# Altium integrated library Weidmueller_OMNIMATE_Signal.IntLib: 2550 symbols (part 26 of 45)
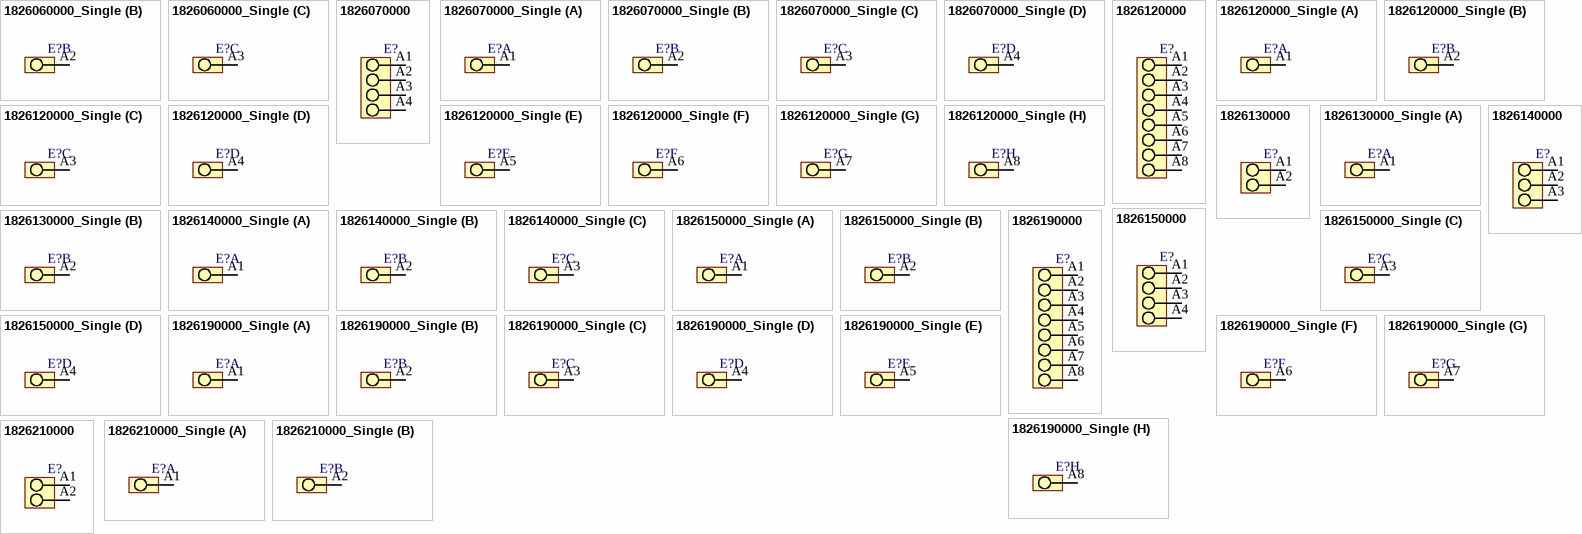
[diagram p236: symbols 1826060000_Single to 1826210000_Single]

## 1826190000
designator E?
OMNIMATE Signal - series LSF; PartNumber: 1826190000; Manufacturer: Weidmueller; Short_text_for_material: LSF-SMT 7.50/08/180 3.5SN BK TU; Side_termination_characteristic: closed side; Mounting_onto_the_PCB: Reflow solder connection; Pitch_mm: 7,5 mm; Pitch_inch: 0,295 inch; No_of_poles: 8; Solder_pin_length_mm: 3,5 mm; Contact_material: Cu-Leg; Contact_surface: tinned; Insulating_material: LCP GF; UL_94_flammability_rating: V-0; Rated_voltage_for_surge_voltage_class_pollution_degree_II_2: 800 V; Rated_current_min_no_of_poles_TU_20_deg_C: 19 A; Solid_min_H05_07_V_U: 0,2 mm²; Solid_max_H05_07_V_U: 1,5 mm²; Rated_voltage_use_group_B_UL_1059: 300 V; Rated_current_use_group_B_UL_1059: 12 A; Wire_cross_section_AWG_min_UL_1059: AWG 24; Wire_cross_section_AWG_max_UL_1059: AWG 16; PackageReference: LSF_SMT_7_5_180_08; Colour: Black; Packaging: Tube; Qty: 9 PCS; Revision: V1; ComponentLink1Description: Manufacturer URL; ComponentLink1URL: http://www.weidmueller.com/; ComponentLink2Description: URL Link1; ComponentLink2URL: http://catalog.weidmueller.com/catalog/Start.do?localeId=en&ObjectID=1826190000
footprint LSF_SMT_7_5_180_08 (OMNIMATE Signal - Serie LSF  LSF-SMT 7.50/08/180 3.5)
pins: A1, A2, A3, A4, A5, A6, A7, A8
1 alternate drawing of the same symbol

## 1826190000_Single
designator E?
OMNIMATE Signal - series LSF; PartNumber: 1826190000; Manufacturer: Weidmueller; Short_text_for_material: LSF-SMT 7.50/08/180 3.5SN BK TU; Side_termination_characteristic: closed side; Mounting_onto_the_PCB: Reflow solder connection; Pitch_mm: 7,5 mm; Pitch_inch: 0,295 inch; No_of_poles: 8; Solder_pin_length_mm: 3,5 mm; Contact_material: Cu-Leg; Contact_surface: tinned; Insulating_material: LCP GF; UL_94_flammability_rating: V-0; Rated_voltage_for_surge_voltage_class_pollution_degree_II_2: 800 V; Rated_current_min_no_of_poles_TU_20_deg_C: 19 A; Solid_min_H05_07_V_U: 0,2 mm²; Solid_max_H05_07_V_U: 1,5 mm²; Rated_voltage_use_group_B_UL_1059: 300 V; Rated_current_use_group_B_UL_1059: 12 A; Wire_cross_section_AWG_min_UL_1059: AWG 24; Wire_cross_section_AWG_max_UL_1059: AWG 16; PackageReference: LSF_SMT_7_5_180_08; Colour: Black; Packaging: Tube; Qty: 9 PCS; Revision: V1; ComponentLink1Description: Manufacturer URL; ComponentLink1URL: http://www.weidmueller.com/; ComponentLink2Description: URL Link1; ComponentLink2URL: http://catalog.weidmueller.com/catalog/Start.do?localeId=en&ObjectID=1826190000
footprint LSF_SMT_7_5_180_08 (OMNIMATE Signal - Serie LSF  LSF-SMT 7.50/08/180 3.5)
part A pins: A1
part B pins: A2
part C pins: A3
part D pins: A4
part E pins: A5
part F pins: A6
part G pins: A7
part H pins: A8
1 alternate drawing of the same symbol

## 1826210000
designator E?
OMNIMATE Signal - series LSF; PartNumber: 1826210000; Manufacturer: Weidmueller; Short_text_for_material: LSF-SMT 7.62/02/180 3.5SN BK TU; Side_termination_characteristic: closed side; Mounting_onto_the_PCB: Reflow solder connection; Pitch_mm: 7,62 mm; Pitch_inch: 0,3 inch; No_of_poles: 2; Solder_pin_length_mm: 3,5 mm; Contact_material: Cu-Leg; Contact_surface: tinned; Insulating_material: LCP GF; UL_94_flammability_rating: V-0; Rated_voltage_for_surge_voltage_class_pollution_degree_II_2: 800 V; Rated_current_min_no_of_poles_TU_20_deg_C: 19 A; Solid_min_H05_07_V_U: 0,2 mm²; Solid_max_H05_07_V_U: 1,5 mm²; Rated_voltage_use_group_B_UL_1059: 300 V; Rated_current_use_group_B_UL_1059: 12 A; Wire_cross_section_AWG_min_UL_1059: AWG 24; Wire_cross_section_AWG_max_UL_1059: AWG 16; PackageReference: LSF_SMT_7_62_180_02; Colour: Black; Packaging: Tube; Qty: 46 PCS; Revision: V1; ComponentLink1Description: Manufacturer URL; ComponentLink1URL: http://www.weidmueller.com/; ComponentLink2Description: URL Link1; ComponentLink2URL: http://catalog.weidmueller.com/catalog/Start.do?localeId=en&ObjectID=1826210000
footprint LSF_SMT_7_62_180_02 (OMNIMATE Signal - Serie LSF  LSF-SMT 7.62/02/180 3.5)
pins: A1, A2
1 alternate drawing of the same symbol

## 1826210000_Single
designator E?
OMNIMATE Signal - series LSF; PartNumber: 1826210000; Manufacturer: Weidmueller; Short_text_for_material: LSF-SMT 7.62/02/180 3.5SN BK TU; Side_termination_characteristic: closed side; Mounting_onto_the_PCB: Reflow solder connection; Pitch_mm: 7,62 mm; Pitch_inch: 0,3 inch; No_of_poles: 2; Solder_pin_length_mm: 3,5 mm; Contact_material: Cu-Leg; Contact_surface: tinned; Insulating_material: LCP GF; UL_94_flammability_rating: V-0; Rated_voltage_for_surge_voltage_class_pollution_degree_II_2: 800 V; Rated_current_min_no_of_poles_TU_20_deg_C: 19 A; Solid_min_H05_07_V_U: 0,2 mm²; Solid_max_H05_07_V_U: 1,5 mm²; Rated_voltage_use_group_B_UL_1059: 300 V; Rated_current_use_group_B_UL_1059: 12 A; Wire_cross_section_AWG_min_UL_1059: AWG 24; Wire_cross_section_AWG_max_UL_1059: AWG 16; PackageReference: LSF_SMT_7_62_180_02; Colour: Black; Packaging: Tube; Qty: 46 PCS; Revision: V1; ComponentLink1Description: Manufacturer URL; ComponentLink1URL: http://www.weidmueller.com/; ComponentLink2Description: URL Link1; ComponentLink2URL: http://catalog.weidmueller.com/catalog/Start.do?localeId=en&ObjectID=1826210000
footprint LSF_SMT_7_62_180_02 (OMNIMATE Signal - Serie LSF  LSF-SMT 7.62/02/180 3.5)
part A pins: A1
part B pins: A2
1 alternate drawing of the same symbol

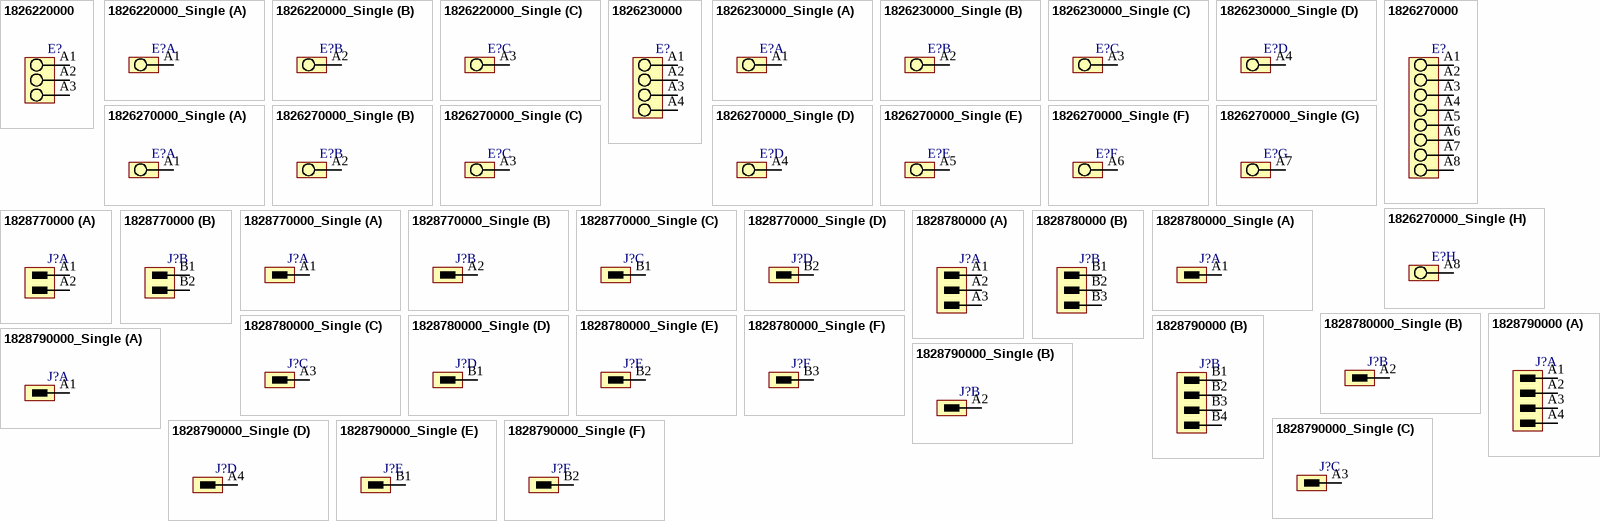
[diagram p132: symbols 1826220000 to 1828790000_Single]

## 1826220000
designator E?
OMNIMATE Signal - series LSF; PartNumber: 1826220000; Manufacturer: Weidmueller; Short_text_for_material: LSF-SMT 7.62/03/180 3.5SN BK TU; Side_termination_characteristic: closed side; Mounting_onto_the_PCB: Reflow solder connection; Pitch_mm: 7,62 mm; Pitch_inch: 0,3 inch; No_of_poles: 3; Solder_pin_length_mm: 3,5 mm; Contact_material: Cu-Leg; Contact_surface: tinned; Insulating_material: LCP GF; UL_94_flammability_rating: V-0; Rated_voltage_for_surge_voltage_class_pollution_degree_II_2: 800 V; Rated_current_min_no_of_poles_TU_20_deg_C: 19 A; Solid_min_H05_07_V_U: 0,2 mm²; Solid_max_H05_07_V_U: 1,5 mm²; Rated_voltage_use_group_B_UL_1059: 300 V; Rated_current_use_group_B_UL_1059: 12 A; Wire_cross_section_AWG_min_UL_1059: AWG 24; Wire_cross_section_AWG_max_UL_1059: AWG 16; PackageReference: LSF_SMT_7_62_180_03; Colour: Black; Packaging: Tube; Qty: 28 PCS; Revision: V1; ComponentLink1Description: Manufacturer URL; ComponentLink1URL: http://www.weidmueller.com/; ComponentLink2Description: URL Link1; ComponentLink2URL: http://catalog.weidmueller.com/catalog/Start.do?localeId=en&ObjectID=1826220000
footprint LSF_SMT_7_62_180_03 (OMNIMATE Signal - Serie LSF  LSF-SMT 7.62/03/180 3.5)
pins: A1, A2, A3
1 alternate drawing of the same symbol

## 1826220000_Single
designator E?
OMNIMATE Signal - series LSF; PartNumber: 1826220000; Manufacturer: Weidmueller; Short_text_for_material: LSF-SMT 7.62/03/180 3.5SN BK TU; Side_termination_characteristic: closed side; Mounting_onto_the_PCB: Reflow solder connection; Pitch_mm: 7,62 mm; Pitch_inch: 0,3 inch; No_of_poles: 3; Solder_pin_length_mm: 3,5 mm; Contact_material: Cu-Leg; Contact_surface: tinned; Insulating_material: LCP GF; UL_94_flammability_rating: V-0; Rated_voltage_for_surge_voltage_class_pollution_degree_II_2: 800 V; Rated_current_min_no_of_poles_TU_20_deg_C: 19 A; Solid_min_H05_07_V_U: 0,2 mm²; Solid_max_H05_07_V_U: 1,5 mm²; Rated_voltage_use_group_B_UL_1059: 300 V; Rated_current_use_group_B_UL_1059: 12 A; Wire_cross_section_AWG_min_UL_1059: AWG 24; Wire_cross_section_AWG_max_UL_1059: AWG 16; PackageReference: LSF_SMT_7_62_180_03; Colour: Black; Packaging: Tube; Qty: 28 PCS; Revision: V1; ComponentLink1Description: Manufacturer URL; ComponentLink1URL: http://www.weidmueller.com/; ComponentLink2Description: URL Link1; ComponentLink2URL: http://catalog.weidmueller.com/catalog/Start.do?localeId=en&ObjectID=1826220000
footprint LSF_SMT_7_62_180_03 (OMNIMATE Signal - Serie LSF  LSF-SMT 7.62/03/180 3.5)
part A pins: A1
part B pins: A2
part C pins: A3
1 alternate drawing of the same symbol

## 1826230000
designator E?
OMNIMATE Signal - series LSF; PartNumber: 1826230000; Manufacturer: Weidmueller; Short_text_for_material: LSF-SMT 7.62/04/180 3.5SN BK TU; Side_termination_characteristic: closed side; Mounting_onto_the_PCB: Reflow solder connection; Pitch_mm: 7,62 mm; Pitch_inch: 0,3 inch; No_of_poles: 4; Solder_pin_length_mm: 3,5 mm; Contact_material: Cu-Leg; Contact_surface: tinned; Insulating_material: LCP GF; UL_94_flammability_rating: V-0; Rated_voltage_for_surge_voltage_class_pollution_degree_II_2: 800 V; Rated_current_min_no_of_poles_TU_20_deg_C: 19 A; Solid_min_H05_07_V_U: 0,2 mm²; Solid_max_H05_07_V_U: 1,5 mm²; Rated_voltage_use_group_B_UL_1059: 300 V; Rated_current_use_group_B_UL_1059: 12 A; Wire_cross_section_AWG_min_UL_1059: AWG 24; Wire_cross_section_AWG_max_UL_1059: AWG 16; PackageReference: LSF_SMT_7_62_180_04; Colour: Black; Packaging: Tube; Qty: 20 PCS; Revision: V1; ComponentLink1Description: Manufacturer URL; ComponentLink1URL: http://www.weidmueller.com/; ComponentLink2Description: URL Link1; ComponentLink2URL: http://catalog.weidmueller.com/catalog/Start.do?localeId=en&ObjectID=1826230000
footprint LSF_SMT_7_62_180_04 (OMNIMATE Signal - Serie LSF  LSF-SMT 7.62/04/180 3.5)
pins: A1, A2, A3, A4
1 alternate drawing of the same symbol

## 1826230000_Single
designator E?
OMNIMATE Signal - series LSF; PartNumber: 1826230000; Manufacturer: Weidmueller; Short_text_for_material: LSF-SMT 7.62/04/180 3.5SN BK TU; Side_termination_characteristic: closed side; Mounting_onto_the_PCB: Reflow solder connection; Pitch_mm: 7,62 mm; Pitch_inch: 0,3 inch; No_of_poles: 4; Solder_pin_length_mm: 3,5 mm; Contact_material: Cu-Leg; Contact_surface: tinned; Insulating_material: LCP GF; UL_94_flammability_rating: V-0; Rated_voltage_for_surge_voltage_class_pollution_degree_II_2: 800 V; Rated_current_min_no_of_poles_TU_20_deg_C: 19 A; Solid_min_H05_07_V_U: 0,2 mm²; Solid_max_H05_07_V_U: 1,5 mm²; Rated_voltage_use_group_B_UL_1059: 300 V; Rated_current_use_group_B_UL_1059: 12 A; Wire_cross_section_AWG_min_UL_1059: AWG 24; Wire_cross_section_AWG_max_UL_1059: AWG 16; PackageReference: LSF_SMT_7_62_180_04; Colour: Black; Packaging: Tube; Qty: 20 PCS; Revision: V1; ComponentLink1Description: Manufacturer URL; ComponentLink1URL: http://www.weidmueller.com/; ComponentLink2Description: URL Link1; ComponentLink2URL: http://catalog.weidmueller.com/catalog/Start.do?localeId=en&ObjectID=1826230000
footprint LSF_SMT_7_62_180_04 (OMNIMATE Signal - Serie LSF  LSF-SMT 7.62/04/180 3.5)
part A pins: A1
part B pins: A2
part C pins: A3
part D pins: A4
1 alternate drawing of the same symbol

## 1826270000
designator E?
OMNIMATE Signal - series LSF; PartNumber: 1826270000; Manufacturer: Weidmueller; Short_text_for_material: LSF-SMT 7.62/08/180 3.5SN BK TU; Side_termination_characteristic: closed side; Mounting_onto_the_PCB: Reflow solder connection; Pitch_mm: 7,62 mm; Pitch_inch: 0,3 inch; No_of_poles: 8; Solder_pin_length_mm: 3,5 mm; Contact_material: Cu-Leg; Contact_surface: tinned; Insulating_material: LCP GF; UL_94_flammability_rating: V-0; Rated_voltage_for_surge_voltage_class_pollution_degree_II_2: 800 V; Rated_current_min_no_of_poles_TU_20_deg_C: 19 A; Solid_min_H05_07_V_U: 0,2 mm²; Solid_max_H05_07_V_U: 1,5 mm²; Rated_voltage_use_group_B_UL_1059: 300 V; Rated_current_use_group_B_UL_1059: 12 A; Wire_cross_section_AWG_min_UL_1059: AWG 24; Wire_cross_section_AWG_max_UL_1059: AWG 16; PackageReference: LSF_SMT_7_62_180_08; Colour: Black; Packaging: Tube; Qty: 9 PCS; Revision: V1; ComponentLink1Description: Manufacturer URL; ComponentLink1URL: http://www.weidmueller.com/; ComponentLink2Description: URL Link1; ComponentLink2URL: http://catalog.weidmueller.com/catalog/Start.do?localeId=en&ObjectID=1826270000
footprint LSF_SMT_7_62_180_08 (OMNIMATE Signal - Serie LSF  LSF-SMT 7.62/08/180 3.5)
pins: A1, A2, A3, A4, A5, A6, A7, A8
1 alternate drawing of the same symbol

## 1826270000_Single
designator E?
OMNIMATE Signal - series LSF; PartNumber: 1826270000; Manufacturer: Weidmueller; Short_text_for_material: LSF-SMT 7.62/08/180 3.5SN BK TU; Side_termination_characteristic: closed side; Mounting_onto_the_PCB: Reflow solder connection; Pitch_mm: 7,62 mm; Pitch_inch: 0,3 inch; No_of_poles: 8; Solder_pin_length_mm: 3,5 mm; Contact_material: Cu-Leg; Contact_surface: tinned; Insulating_material: LCP GF; UL_94_flammability_rating: V-0; Rated_voltage_for_surge_voltage_class_pollution_degree_II_2: 800 V; Rated_current_min_no_of_poles_TU_20_deg_C: 19 A; Solid_min_H05_07_V_U: 0,2 mm²; Solid_max_H05_07_V_U: 1,5 mm²; Rated_voltage_use_group_B_UL_1059: 300 V; Rated_current_use_group_B_UL_1059: 12 A; Wire_cross_section_AWG_min_UL_1059: AWG 24; Wire_cross_section_AWG_max_UL_1059: AWG 16; PackageReference: LSF_SMT_7_62_180_08; Colour: Black; Packaging: Tube; Qty: 9 PCS; Revision: V1; ComponentLink1Description: Manufacturer URL; ComponentLink1URL: http://www.weidmueller.com/; ComponentLink2Description: URL Link1; ComponentLink2URL: http://catalog.weidmueller.com/catalog/Start.do?localeId=en&ObjectID=1826270000
footprint LSF_SMT_7_62_180_08 (OMNIMATE Signal - Serie LSF  LSF-SMT 7.62/08/180 3.5)
part A pins: A1
part B pins: A2
part C pins: A3
part D pins: A4
part E pins: A5
part F pins: A6
part G pins: A7
part H pins: A8
1 alternate drawing of the same symbol

## 1828770000
designator J?
OMNIMATE Signal - series BL/SL 5.08; PartNumber: 1828770000; Manufacturer: Weidmueller; Short_text_for_material: SLDV-THR 5.08/04/180F 3.2SN BK BX; Side_termination_characteristic: Flange; Mounting_onto_the_PCB: Reflow solder connection; Pitch_mm: 5.08 mm; Pitch_inch: 0.2 inch; No_of_poles: 4; Outgoing_elbow: 180°; Solder_pin_length_mm: 3.2 mm; Contact_material: CuSn; Contact_surface: tinned; Insulating_material: LCP GF; UL_94_flammability_rating: V-0; Rated_voltage_for_surge_voltage_class_pollution_degree_II_2: 400 V; Rated_current_min_no_of_poles_TU_20_deg_C: 19 A; Rated_voltage_use_group_B_UL_1059: 300 V; Rated_current_use_group_B_UL_1059: 10 A; PackageReference: SLDV_THR_5_08_180F_04; Colour: Black; Packaging: Box; Qty: 50 PCS; Revision: V1; ComponentLink1Description: Manufacturer URL; ComponentLink1URL: http://www.weidmueller.com/; ComponentLink2Description: URL Link1; ComponentLink2URL: http://catalog.weidmueller.com/catalog/Start.do?localeId=en&ObjectID=1828770000
footprint SLDV_THR_5_08_180F_04 (OMNIMATE Signal - Serie BL/SL 5.08  SLDV-THR 5.08/04/180F 3.2)
part A pins: A1, A2
part B pins: B1, B2

## 1828770000_Single
designator J?
OMNIMATE Signal - series BL/SL 5.08; PartNumber: 1828770000; Manufacturer: Weidmueller; Short_text_for_material: SLDV-THR 5.08/04/180F 3.2SN BK BX; Side_termination_characteristic: Flange; Mounting_onto_the_PCB: Reflow solder connection; Pitch_mm: 5.08 mm; Pitch_inch: 0.2 inch; No_of_poles: 4; Outgoing_elbow: 180°; Solder_pin_length_mm: 3.2 mm; Contact_material: CuSn; Contact_surface: tinned; Insulating_material: LCP GF; UL_94_flammability_rating: V-0; Rated_voltage_for_surge_voltage_class_pollution_degree_II_2: 400 V; Rated_current_min_no_of_poles_TU_20_deg_C: 19 A; Rated_voltage_use_group_B_UL_1059: 300 V; Rated_current_use_group_B_UL_1059: 10 A; PackageReference: SLDV_THR_5_08_180F_04; Colour: Black; Packaging: Box; Qty: 50 PCS; Revision: V1; ComponentLink1Description: Manufacturer URL; ComponentLink1URL: http://www.weidmueller.com/; ComponentLink2Description: URL Link1; ComponentLink2URL: http://catalog.weidmueller.com/catalog/Start.do?localeId=en&ObjectID=1828770000
footprint SLDV_THR_5_08_180F_04 (OMNIMATE Signal - Serie BL/SL 5.08  SLDV-THR 5.08/04/180F 3.2)
part A pins: A1
part B pins: A2
part C pins: B1
part D pins: B2

## 1828780000
designator J?
OMNIMATE Signal - series BL/SL 5.08; PartNumber: 1828780000; Manufacturer: Weidmueller; Short_text_for_material: SLDV-THR 5.08/06/180F 3.2SN BK BX; Side_termination_characteristic: Flange; Mounting_onto_the_PCB: Reflow solder connection; Pitch_mm: 5.08 mm; Pitch_inch: 0.2 inch; No_of_poles: 6; Outgoing_elbow: 180°; Solder_pin_length_mm: 3.2 mm; Contact_material: CuSn; Contact_surface: tinned; Insulating_material: LCP GF; UL_94_flammability_rating: V-0; Rated_voltage_for_surge_voltage_class_pollution_degree_II_2: 400 V; Rated_current_min_no_of_poles_TU_20_deg_C: 19 A; Rated_voltage_use_group_B_UL_1059: 300 V; Rated_current_use_group_B_UL_1059: 10 A; PackageReference: SLDV_THR_5_08_180F_06; Colour: Black; Packaging: Box; Qty: 50 PCS; Revision: V1; ComponentLink1Description: Manufacturer URL; ComponentLink1URL: http://www.weidmueller.com/; ComponentLink2Description: URL Link1; ComponentLink2URL: http://catalog.weidmueller.com/catalog/Start.do?localeId=en&ObjectID=1828780000
footprint SLDV_THR_5_08_180F_06 (OMNIMATE Signal - Serie BL/SL 5.08  SLDV-THR 5.08/06/180F 3.2)
part A pins: A1, A2, A3
part B pins: B1, B2, B3

## 1828780000_Single
designator J?
OMNIMATE Signal - series BL/SL 5.08; PartNumber: 1828780000; Manufacturer: Weidmueller; Short_text_for_material: SLDV-THR 5.08/06/180F 3.2SN BK BX; Side_termination_characteristic: Flange; Mounting_onto_the_PCB: Reflow solder connection; Pitch_mm: 5.08 mm; Pitch_inch: 0.2 inch; No_of_poles: 6; Outgoing_elbow: 180°; Solder_pin_length_mm: 3.2 mm; Contact_material: CuSn; Contact_surface: tinned; Insulating_material: LCP GF; UL_94_flammability_rating: V-0; Rated_voltage_for_surge_voltage_class_pollution_degree_II_2: 400 V; Rated_current_min_no_of_poles_TU_20_deg_C: 19 A; Rated_voltage_use_group_B_UL_1059: 300 V; Rated_current_use_group_B_UL_1059: 10 A; PackageReference: SLDV_THR_5_08_180F_06; Colour: Black; Packaging: Box; Qty: 50 PCS; Revision: V1; ComponentLink1Description: Manufacturer URL; ComponentLink1URL: http://www.weidmueller.com/; ComponentLink2Description: URL Link1; ComponentLink2URL: http://catalog.weidmueller.com/catalog/Start.do?localeId=en&ObjectID=1828780000
footprint SLDV_THR_5_08_180F_06 (OMNIMATE Signal - Serie BL/SL 5.08  SLDV-THR 5.08/06/180F 3.2)
part A pins: A1
part B pins: A2
part C pins: A3
part D pins: B1
part E pins: B2
part F pins: B3

## 1828790000
designator J?
OMNIMATE Signal - series BL/SL 5.08; PartNumber: 1828790000; Manufacturer: Weidmueller; Short_text_for_material: SLDV-THR 5.08/08/180F 3.2SN BK BX; Side_termination_characteristic: Flange; Mounting_onto_the_PCB: Reflow solder connection; Pitch_mm: 5.08 mm; Pitch_inch: 0.2 inch; No_of_poles: 8; Outgoing_elbow: 180°; Solder_pin_length_mm: 3.2 mm; Contact_material: CuSn; Contact_surface: tinned; Insulating_material: LCP GF; UL_94_flammability_rating: V-0; Rated_voltage_for_surge_voltage_class_pollution_degree_II_2: 400 V; Rated_current_min_no_of_poles_TU_20_deg_C: 19 A; Rated_voltage_use_group_B_UL_1059: 300 V; Rated_current_use_group_B_UL_1059: 10 A; PackageReference: SLDV_THR_5_08_180F_08; Colour: Black; Packaging: Box; Qty: 50 PCS; Revision: V1; ComponentLink1Description: Manufacturer URL; ComponentLink1URL: http://www.weidmueller.com/; ComponentLink2Description: URL Link1; ComponentLink2URL: http://catalog.weidmueller.com/catalog/Start.do?localeId=en&ObjectID=1828790000
footprint SLDV_THR_5_08_180F_08 (OMNIMATE Signal - Serie BL/SL 5.08  SLDV-THR 5.08/08/180F 3.2)
part A pins: A1, A2, A3, A4
part B pins: B1, B2, B3, B4

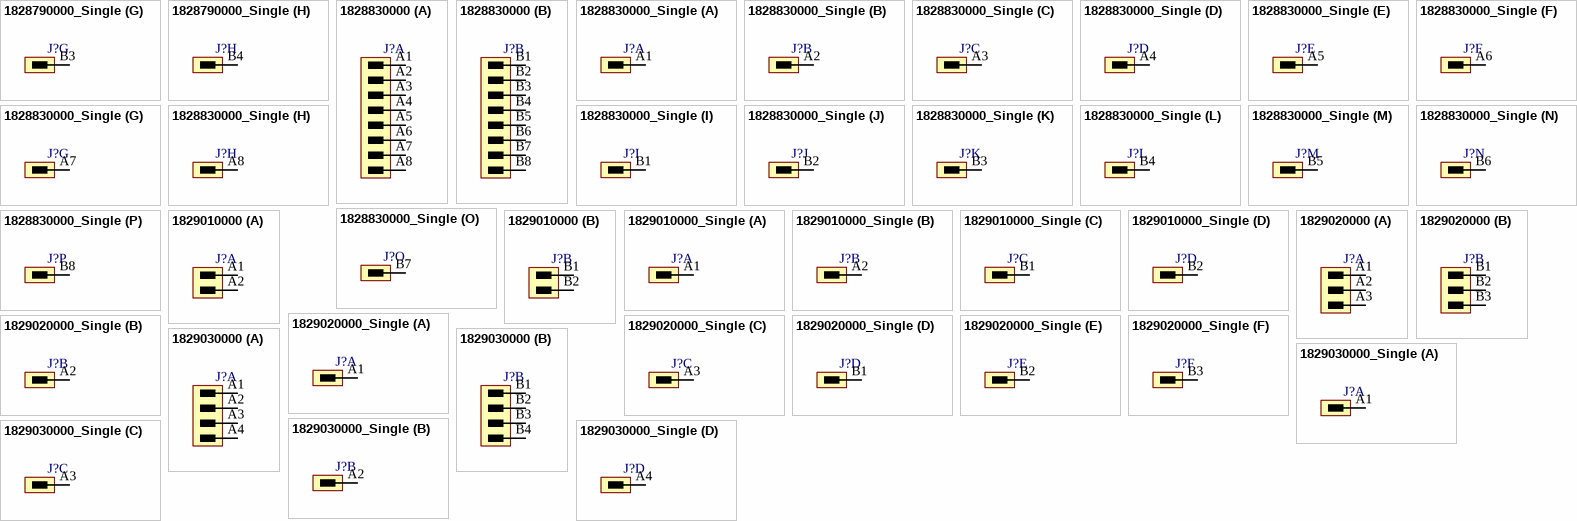
[diagram p133: symbols 1828790000_Single to 1829030000_Single]

## 1828790000_Single
designator J?
OMNIMATE Signal - series BL/SL 5.08; PartNumber: 1828790000; Manufacturer: Weidmueller; Short_text_for_material: SLDV-THR 5.08/08/180F 3.2SN BK BX; Side_termination_characteristic: Flange; Mounting_onto_the_PCB: Reflow solder connection; Pitch_mm: 5.08 mm; Pitch_inch: 0.2 inch; No_of_poles: 8; Outgoing_elbow: 180°; Solder_pin_length_mm: 3.2 mm; Contact_material: CuSn; Contact_surface: tinned; Insulating_material: LCP GF; UL_94_flammability_rating: V-0; Rated_voltage_for_surge_voltage_class_pollution_degree_II_2: 400 V; Rated_current_min_no_of_poles_TU_20_deg_C: 19 A; Rated_voltage_use_group_B_UL_1059: 300 V; Rated_current_use_group_B_UL_1059: 10 A; PackageReference: SLDV_THR_5_08_180F_08; Colour: Black; Packaging: Box; Qty: 50 PCS; Revision: V1; ComponentLink1Description: Manufacturer URL; ComponentLink1URL: http://www.weidmueller.com/; ComponentLink2Description: URL Link1; ComponentLink2URL: http://catalog.weidmueller.com/catalog/Start.do?localeId=en&ObjectID=1828790000
footprint SLDV_THR_5_08_180F_08 (OMNIMATE Signal - Serie BL/SL 5.08  SLDV-THR 5.08/08/180F 3.2)
part A pins: A1
part B pins: A2
part C pins: A3
part D pins: A4
part E pins: B1
part F pins: B2
part G pins: B3
part H pins: B4

## 1828830000
designator J?
OMNIMATE Signal - series BL/SL 5.08; PartNumber: 1828830000; Manufacturer: Weidmueller; Short_text_for_material: SLDV-THR 5.08/16/180F 3.2SN BK BX; Side_termination_characteristic: Flange; Mounting_onto_the_PCB: Reflow solder connection; Pitch_mm: 5.08 mm; Pitch_inch: 0.2 inch; No_of_poles: 16; Outgoing_elbow: 180°; Solder_pin_length_mm: 3.2 mm; Contact_material: CuSn; Contact_surface: tinned; Insulating_material: LCP GF; UL_94_flammability_rating: V-0; Rated_voltage_for_surge_voltage_class_pollution_degree_II_2: 400 V; Rated_current_min_no_of_poles_TU_20_deg_C: 19 A; Rated_voltage_use_group_B_UL_1059: 300 V; Rated_current_use_group_B_UL_1059: 10 A; PackageReference: SLDV_THR_5_08_180F_16; Colour: Black; Packaging: Box; Qty: 20 PCS; Revision: V1; ComponentLink1Description: Manufacturer URL; ComponentLink1URL: http://www.weidmueller.com/; ComponentLink2Description: URL Link1; ComponentLink2URL: http://catalog.weidmueller.com/catalog/Start.do?localeId=en&ObjectID=1828830000
footprint SLDV_THR_5_08_180F_16 (OMNIMATE Signal - Serie BL/SL 5.08  SLDV-THR 5.08/16/180F 3.2)
part A pins: A1, A2, A3, A4, A5, A6, A7, A8
part B pins: B1, B2, B3, B4, B5, B6, B7, B8

## 1828830000_Single
designator J?
OMNIMATE Signal - series BL/SL 5.08; PartNumber: 1828830000; Manufacturer: Weidmueller; Short_text_for_material: SLDV-THR 5.08/16/180F 3.2SN BK BX; Side_termination_characteristic: Flange; Mounting_onto_the_PCB: Reflow solder connection; Pitch_mm: 5.08 mm; Pitch_inch: 0.2 inch; No_of_poles: 16; Outgoing_elbow: 180°; Solder_pin_length_mm: 3.2 mm; Contact_material: CuSn; Contact_surface: tinned; Insulating_material: LCP GF; UL_94_flammability_rating: V-0; Rated_voltage_for_surge_voltage_class_pollution_degree_II_2: 400 V; Rated_current_min_no_of_poles_TU_20_deg_C: 19 A; Rated_voltage_use_group_B_UL_1059: 300 V; Rated_current_use_group_B_UL_1059: 10 A; PackageReference: SLDV_THR_5_08_180F_16; Colour: Black; Packaging: Box; Qty: 20 PCS; Revision: V1; ComponentLink1Description: Manufacturer URL; ComponentLink1URL: http://www.weidmueller.com/; ComponentLink2Description: URL Link1; ComponentLink2URL: http://catalog.weidmueller.com/catalog/Start.do?localeId=en&ObjectID=1828830000
footprint SLDV_THR_5_08_180F_16 (OMNIMATE Signal - Serie BL/SL 5.08  SLDV-THR 5.08/16/180F 3.2)
part A pins: A1
part B pins: A2
part C pins: A3
part D pins: A4
part E pins: A5
part F pins: A6
part G pins: A7
part H pins: A8
part I pins: B1
part J pins: B2
part K pins: B3
part L pins: B4
part M pins: B5
part N pins: B6
part O pins: B7
part P pins: B8

## 1829010000
designator J?
OMNIMATE Signal - series BL/SL 5.08; PartNumber: 1829010000; Manufacturer: Weidmueller; Short_text_for_material: SLDV-THR 5.08/04/180FLF 3.2SN BK BX; Side_termination_characteristic: Flange / Solder flange; Mounting_onto_the_PCB: Reflow solder connection; Pitch_mm: 5.08 mm; Pitch_inch: 0.2 inch; No_of_poles: 4; Outgoing_elbow: 180°; Solder_pin_length_mm: 3.2 mm; Contact_material: CuSn; Contact_surface: tinned; Insulating_material: LCP GF; UL_94_flammability_rating: V-0; Rated_voltage_for_surge_voltage_class_pollution_degree_II_2: 400 V; Rated_current_min_no_of_poles_TU_20_deg_C: 19 A; Rated_voltage_use_group_B_UL_1059: 300 V; Rated_current_use_group_B_UL_1059: 10 A; PackageReference: SLDV_THR_5_08_180FLF_04; Colour: Black; Packaging: Box; Qty: 50 PCS; Revision: V1; ComponentLink1Description: Manufacturer URL; ComponentLink1URL: http://www.weidmueller.com/; ComponentLink2Description: URL Link1; ComponentLink2URL: http://catalog.weidmueller.com/catalog/Start.do?localeId=en&ObjectID=1829010000
footprint SLDV_THR_5_08_180FLF_04 (OMNIMATE Signal - Serie BL/SL 5.08  SLDV-THR 5.08/04/180FLF 3.2)
part A pins: A1, A2
part B pins: B1, B2

## 1829010000_Single
designator J?
OMNIMATE Signal - series BL/SL 5.08; PartNumber: 1829010000; Manufacturer: Weidmueller; Short_text_for_material: SLDV-THR 5.08/04/180FLF 3.2SN BK BX; Side_termination_characteristic: Flange / Solder flange; Mounting_onto_the_PCB: Reflow solder connection; Pitch_mm: 5.08 mm; Pitch_inch: 0.2 inch; No_of_poles: 4; Outgoing_elbow: 180°; Solder_pin_length_mm: 3.2 mm; Contact_material: CuSn; Contact_surface: tinned; Insulating_material: LCP GF; UL_94_flammability_rating: V-0; Rated_voltage_for_surge_voltage_class_pollution_degree_II_2: 400 V; Rated_current_min_no_of_poles_TU_20_deg_C: 19 A; Rated_voltage_use_group_B_UL_1059: 300 V; Rated_current_use_group_B_UL_1059: 10 A; PackageReference: SLDV_THR_5_08_180FLF_04; Colour: Black; Packaging: Box; Qty: 50 PCS; Revision: V1; ComponentLink1Description: Manufacturer URL; ComponentLink1URL: http://www.weidmueller.com/; ComponentLink2Description: URL Link1; ComponentLink2URL: http://catalog.weidmueller.com/catalog/Start.do?localeId=en&ObjectID=1829010000
footprint SLDV_THR_5_08_180FLF_04 (OMNIMATE Signal - Serie BL/SL 5.08  SLDV-THR 5.08/04/180FLF 3.2)
part A pins: A1
part B pins: A2
part C pins: B1
part D pins: B2

## 1829020000
designator J?
OMNIMATE Signal - series BL/SL 5.08; PartNumber: 1829020000; Manufacturer: Weidmueller; Short_text_for_material: SLDV-THR 5.08/06/180FLF 3.2SN BK BX; Side_termination_characteristic: Flange / Solder flange; Mounting_onto_the_PCB: Reflow solder connection; Pitch_mm: 5.08 mm; Pitch_inch: 0.2 inch; No_of_poles: 6; Outgoing_elbow: 180°; Solder_pin_length_mm: 3.2 mm; Contact_material: CuSn; Contact_surface: tinned; Insulating_material: LCP GF; UL_94_flammability_rating: V-0; Rated_voltage_for_surge_voltage_class_pollution_degree_II_2: 400 V; Rated_current_min_no_of_poles_TU_20_deg_C: 19 A; Rated_voltage_use_group_B_UL_1059: 300 V; Rated_current_use_group_B_UL_1059: 10 A; PackageReference: SLDV_THR_5_08_180FLF_06; Colour: Black; Packaging: Box; Qty: 50 PCS; Revision: V1; ComponentLink1Description: Manufacturer URL; ComponentLink1URL: http://www.weidmueller.com/; ComponentLink2Description: URL Link1; ComponentLink2URL: http://catalog.weidmueller.com/catalog/Start.do?localeId=en&ObjectID=1829020000
footprint SLDV_THR_5_08_180FLF_06 (OMNIMATE Signal - Serie BL/SL 5.08  SLDV-THR 5.08/06/180FLF 3.2)
part A pins: A1, A2, A3
part B pins: B1, B2, B3

## 1829020000_Single
designator J?
OMNIMATE Signal - series BL/SL 5.08; PartNumber: 1829020000; Manufacturer: Weidmueller; Short_text_for_material: SLDV-THR 5.08/06/180FLF 3.2SN BK BX; Side_termination_characteristic: Flange / Solder flange; Mounting_onto_the_PCB: Reflow solder connection; Pitch_mm: 5.08 mm; Pitch_inch: 0.2 inch; No_of_poles: 6; Outgoing_elbow: 180°; Solder_pin_length_mm: 3.2 mm; Contact_material: CuSn; Contact_surface: tinned; Insulating_material: LCP GF; UL_94_flammability_rating: V-0; Rated_voltage_for_surge_voltage_class_pollution_degree_II_2: 400 V; Rated_current_min_no_of_poles_TU_20_deg_C: 19 A; Rated_voltage_use_group_B_UL_1059: 300 V; Rated_current_use_group_B_UL_1059: 10 A; PackageReference: SLDV_THR_5_08_180FLF_06; Colour: Black; Packaging: Box; Qty: 50 PCS; Revision: V1; ComponentLink1Description: Manufacturer URL; ComponentLink1URL: http://www.weidmueller.com/; ComponentLink2Description: URL Link1; ComponentLink2URL: http://catalog.weidmueller.com/catalog/Start.do?localeId=en&ObjectID=1829020000
footprint SLDV_THR_5_08_180FLF_06 (OMNIMATE Signal - Serie BL/SL 5.08  SLDV-THR 5.08/06/180FLF 3.2)
part A pins: A1
part B pins: A2
part C pins: A3
part D pins: B1
part E pins: B2
part F pins: B3

## 1829030000
designator J?
OMNIMATE Signal - series BL/SL 5.08; PartNumber: 1829030000; Manufacturer: Weidmueller; Short_text_for_material: SLDV-THR 5.08/08/180FLF 3.2SN BK BX; Side_termination_characteristic: Flange / Solder flange; Mounting_onto_the_PCB: Reflow solder connection; Pitch_mm: 5.08 mm; Pitch_inch: 0.2 inch; No_of_poles: 8; Outgoing_elbow: 180°; Solder_pin_length_mm: 3.2 mm; Contact_material: CuSn; Contact_surface: tinned; Insulating_material: LCP GF; UL_94_flammability_rating: V-0; Rated_voltage_for_surge_voltage_class_pollution_degree_II_2: 400 V; Rated_current_min_no_of_poles_TU_20_deg_C: 19 A; Rated_voltage_use_group_B_UL_1059: 300 V; Rated_current_use_group_B_UL_1059: 10 A; PackageReference: SLDV_THR_5_08_180FLF_08; Colour: Black; Packaging: Box; Qty: 50 PCS; Revision: V1; ComponentLink1Description: Manufacturer URL; ComponentLink1URL: http://www.weidmueller.com/; ComponentLink2Description: URL Link1; ComponentLink2URL: http://catalog.weidmueller.com/catalog/Start.do?localeId=en&ObjectID=1829030000
footprint SLDV_THR_5_08_180FLF_08 (OMNIMATE Signal - Serie BL/SL 5.08  SLDV-THR 5.08/08/180FLF 3.2)
part A pins: A1, A2, A3, A4
part B pins: B1, B2, B3, B4

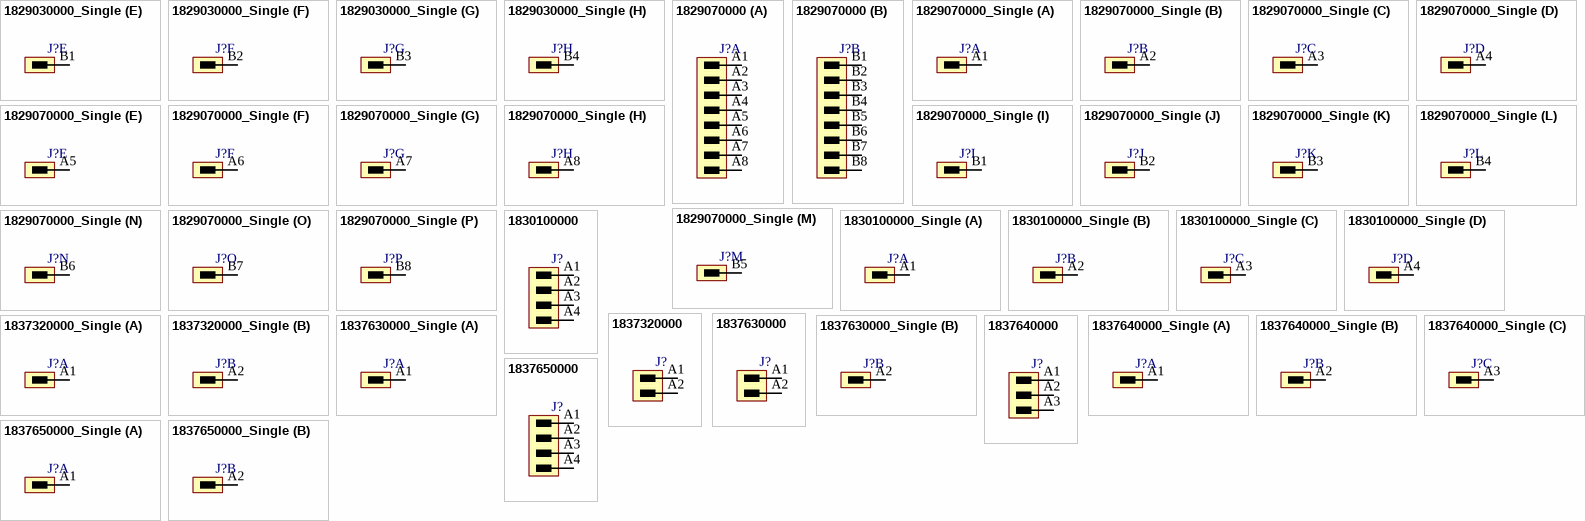
[diagram p134: symbols 1829030000_Single to 1837650000_Single]

## 1829030000_Single
designator J?
OMNIMATE Signal - series BL/SL 5.08; PartNumber: 1829030000; Manufacturer: Weidmueller; Short_text_for_material: SLDV-THR 5.08/08/180FLF 3.2SN BK BX; Side_termination_characteristic: Flange / Solder flange; Mounting_onto_the_PCB: Reflow solder connection; Pitch_mm: 5.08 mm; Pitch_inch: 0.2 inch; No_of_poles: 8; Outgoing_elbow: 180°; Solder_pin_length_mm: 3.2 mm; Contact_material: CuSn; Contact_surface: tinned; Insulating_material: LCP GF; UL_94_flammability_rating: V-0; Rated_voltage_for_surge_voltage_class_pollution_degree_II_2: 400 V; Rated_current_min_no_of_poles_TU_20_deg_C: 19 A; Rated_voltage_use_group_B_UL_1059: 300 V; Rated_current_use_group_B_UL_1059: 10 A; PackageReference: SLDV_THR_5_08_180FLF_08; Colour: Black; Packaging: Box; Qty: 50 PCS; Revision: V1; ComponentLink1Description: Manufacturer URL; ComponentLink1URL: http://www.weidmueller.com/; ComponentLink2Description: URL Link1; ComponentLink2URL: http://catalog.weidmueller.com/catalog/Start.do?localeId=en&ObjectID=1829030000
footprint SLDV_THR_5_08_180FLF_08 (OMNIMATE Signal - Serie BL/SL 5.08  SLDV-THR 5.08/08/180FLF 3.2)
part A pins: A1
part B pins: A2
part C pins: A3
part D pins: A4
part E pins: B1
part F pins: B2
part G pins: B3
part H pins: B4

## 1829070000
designator J?